# Altium footprint library MS-Electronic.PcbLib: 213 footprints (part 11 of 14)
Each footprint in its own frame and in the unit in brackets; x right, y up, seen from the top. Pads: shape width x height; smd on the part's side, far side on the other; paste and mask are expansions set on the pad; w line width, h text height; cw(c..) or ccw(c..) is an arc to the next point about the centre after c.
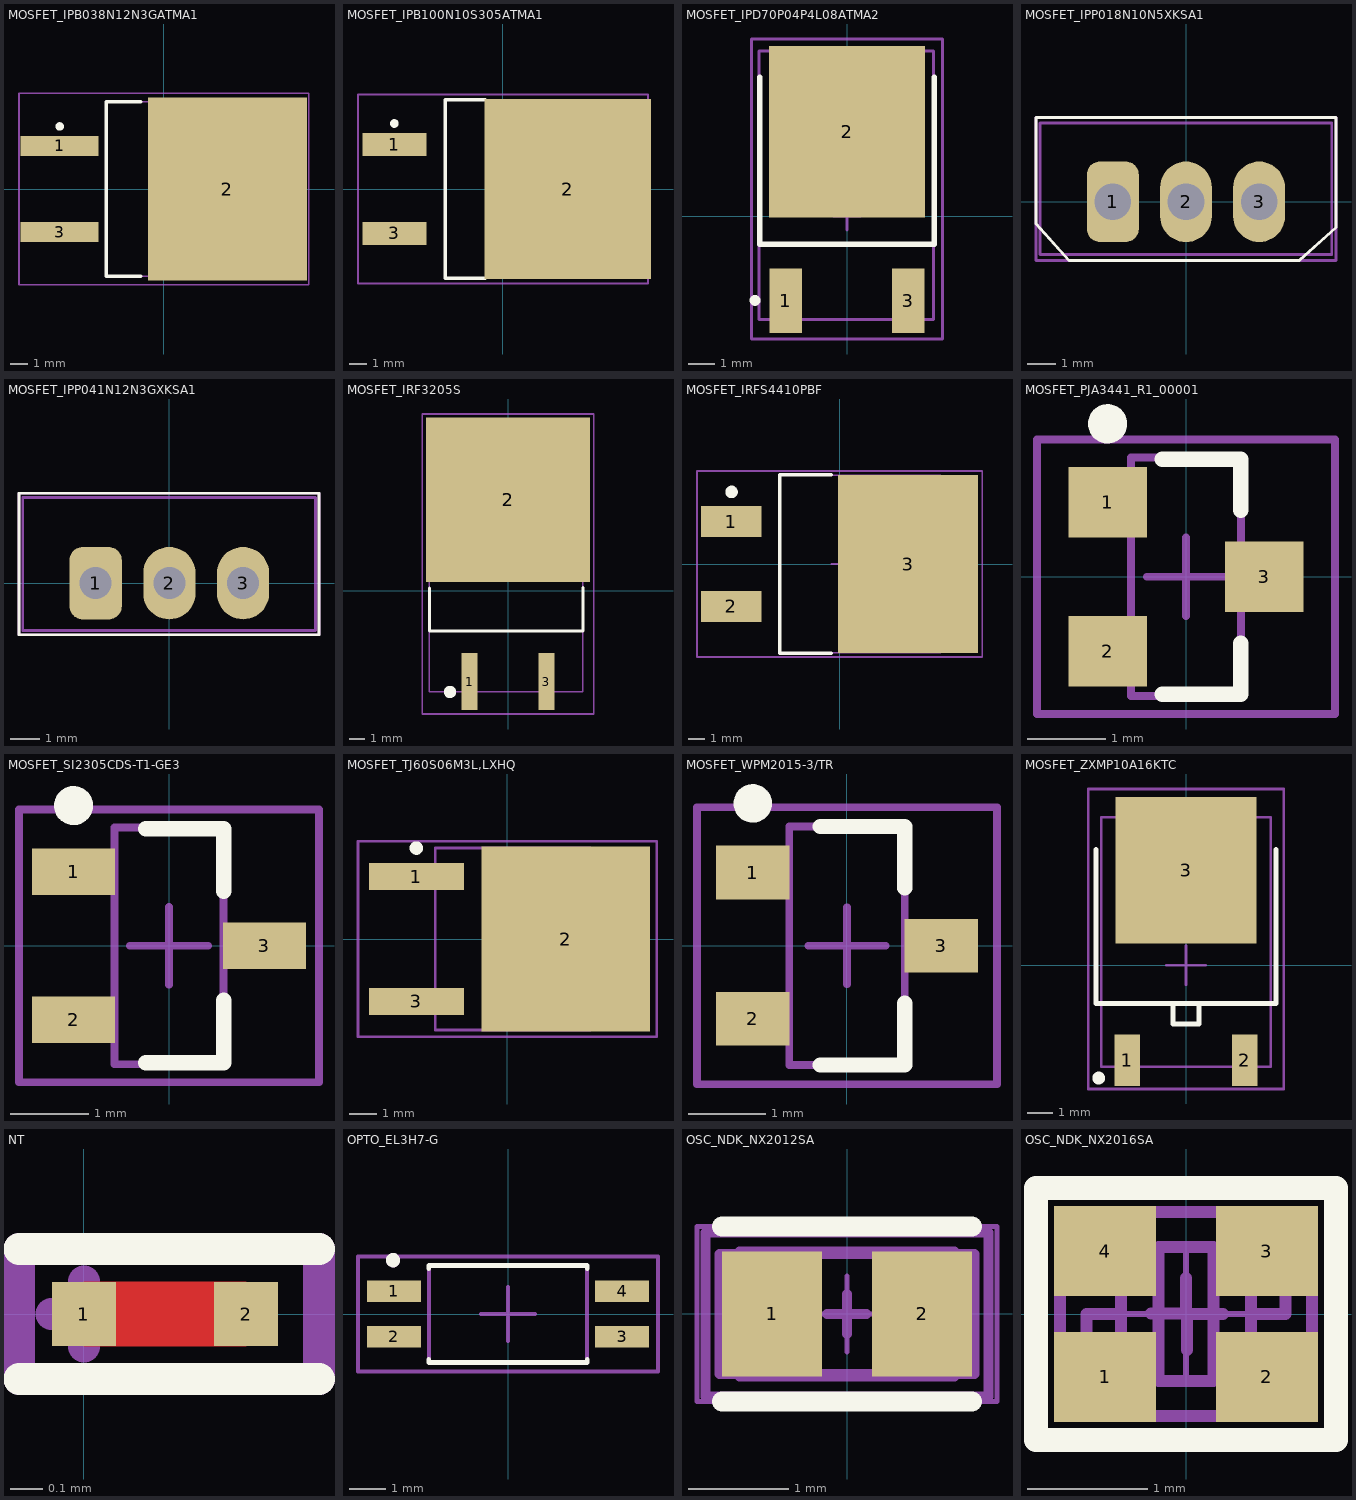
[diagram p10: the footprints below, top view; thin cyan lines are the x and y axes]

## MOSFET_IPB038N12N3GATMA1 [mm]
height 4.58
pads (3):
  rect 4.6x1.2 smd: 1(-6.15,2.54) 3(-6.15,-2.54)
  rect 9.4x10.8 smd: 2(3.75,0)
Top Overlay:
  circle w0.25: c-6.15,3.69 r0.125
  lines w0.2: -1.35,-5.15 -3.4,-5.15 -3.4,5.15 -1.35,5.15
Top Assembly:
  lines w0.1: -3.4,-5.15 6.05,-5.15 6.05,5.15 -3.4,5.15 -3.4,-5.15
  text ".Designator" at -2.499,-0.167 h0.5
Top Component Center (Mech15):
  lines w0.1: -0.5,0 0.5,0 ; 0,-0.5 0,0.5 ; -8.55,-5.65 8.55,-5.65 8.55,5.65 -8.55,5.65 -8.55,-5.65
3D body "MOSFET_IPB038N12N3GATMA1.step": height 4.57, standoff 0, extent -7.19,-5.15 8.05,5.15

## MOSFET_IPB100N10S305ATMA1 [mm]
height 4.6
pads (3):
  rect 3.65x1.3 smd: 1(-6.2,2.54) 3(-6.2,-2.54)
  rect 9.5x10.3 smd: 2(3.7,0)
Top Overlay:
  circle w0.25: c-6.2,3.74 r0.125
  lines w0.2: -1,-5.1 -3.3,-5.1 -3.3,5.1 -1,5.1
Top Assembly:
  lines w0.1: -3.3,-5.1 6,-5.1 6,5.1 -3.3,5.1 -3.3,-5.1
  text ".Designator" at -4.998,-0.333 h1
Top Component Center (Mech15):
  lines w0.1: -0.5,0 0.5,0 ; 0,-0.5 0,0.5 ; -8.275,-5.4 8.275,-5.4 8.275,5.4 -8.275,5.4 -8.275,-5.4
3D body "MOSFET_IPB100N10S305ATMA1.step": height 4.6, standoff 0, extent -7.1,-5.1 8.1,5.1

## MOSFET_IPD70P04P4L08ATMA2 [mm]
pads (3):
  rect 1.2x2.4 smd: 1(-2.28,-3.15) 3(2.28,-3.15)
  rect 5.8x6.4 smd: 2(0,3.15)
Top Overlay:
  lines w0.2: -3.25,5.18 -3.25,-1.04 3.25,-1.04 3.25,5.18
  lines w0.3: -3.427,-3.184 cw(c-3.427,-3.134) -3.427,-3.084 cw(c-3.427,-3.134) -3.427,-3.184
Top Assembly:
  lines w0.1: -3.277,-3.848 3.226,-3.848 3.226,6.159 -3.277,6.159 -3.277,-3.848
  text ".Designator" at -2.999,-0.2 h0.6
Top Component Center (Mech15):
  lines w0.1: -0.508,0 0,0 ; 0,-0.508 0,0 ; 0,0.508 0,0 ; 0.508,0 0,0 ; -3.556,-4.572 3.556,-4.572 3.556,6.604 -3.556,6.604 -3.556,-4.572
3D body "IPD70P04P4L08ATMA2.stp": height 2.45, standoff 0, extent -3.275,-3.848 3.225,6.157

## MOSFET_IPP018N10N5XKSA1 [mm]
pads (3):
  rrect50% 1.8x2.8 hole 1.27: 1(-2.54,0)
  oval 1.8x2.8 hole 1.27: 2(0,0) 3(2.54,0)
Top Overlay:
  lines w0.1: -5.207,-0.762 -5.207,2.921 5.207,2.921 5.207,-0.889 3.937,-2.032 -4.064,-2.032 -5.207,-0.762
Top Assembly:
  lines w0.1: -5.062,-1.834 -5.062,2.74 5.06,2.74 5.06,-1.834 -5.062,-1.834
  text ".Designator" at -2.999,-0.2 h0.6
Top Component Center (Mech15):
  lines w0.1: -0.478,0 0,0 ; 0,-0.478 0,0 ; 0,0.478 0,0 ; 0.478,0 0,0 ; -5.207,-2.032 -5.207,2.921 5.207,2.921 5.207,-2.032 -5.207,-2.032
3D body "PG-TO220-3.STEP": height 20.15, standoff -8.73, extent -5.05,-1.833 5.05,2.737

## MOSFET_IPP041N12N3GXKSA1 [mm]
pads (3):
  rrect50% 1.8x2.5 hole 1.1: 1(-2.54,0)
  oval 1.8x2.5 hole 1.1: 2(0,0) 3(2.54,0)
Top Overlay:
  lines w0.1: -5.182,-1.778 -5.182,3.099 5.156,3.099 5.156,-1.778 -5.182,-1.778
Top Assembly:
  lines w0.1: -5.052,-1.626 5.033,-1.626 5.033,2.946 -5.052,2.946 -5.052,-1.626
  text ".Designator" at -2.499,-0.167 h0.5
Top Component Center (Mech15):
  lines w0.1: -0.762,0 0,0 ; 0,-0.762 0,0 ; 0,0.762 0,0 ; 0.762,0 0,0 ; -5.182,-1.778 -5.182,3.099 5.156,3.099 5.156,-1.778 -5.182,-1.778
3D body "IPP041N12N3GXKSA1.stp": height 20.18, standoff -17.96, extent -5.015,-1.626 5.015,2.944

## MOSFET_IRF3205S [mm]
pads (3):
  rect 1.06x3.78 smd mask+0.102: 1(-2.54,-6.01) 3(2.54,-6.01)
  rect 10.84x10.88 smd paste-6: 2(0,6.01)
Top Overlay:
  circle w0.5: c-3.835,-6.69 r0.155
  lines w0.2: -5.197,0.185 -5.197,-2.652 4.958,-2.652 4.958,0.209
Top Paste:
  region: -3.9,8.13 -3.9,6.61 -5.15,6.61 -5.15,8.13
  region: -3.9,5.5 -3.9,3.98 -5.15,3.98 -5.15,5.5
  region: -3.9,2.87 -3.9,1.35 -5.15,1.35 -5.15,2.87
  region: -2.09,8.13 -2.09,6.61 -3.34,6.61 -3.34,8.13
  region: -2.09,5.5 -2.09,3.98 -3.34,3.98 -3.34,5.5
  region: -2.09,2.87 -2.09,1.35 -3.34,1.35 -3.34,2.87
  region: 5.15,8.13 5.15,6.61 3.9,6.61 3.9,8.13
  region: 5.15,5.5 5.15,3.98 3.9,3.98 3.9,5.5
  region: 5.15,2.87 5.15,1.35 3.9,1.35 3.9,2.87
  region: 3.34,8.13 3.34,6.61 2.09,6.61 2.09,8.13
  region: 3.34,5.5 3.34,3.98 2.09,3.98 2.09,5.5
  region: 3.34,2.87 3.34,1.35 2.09,1.35 2.09,2.87
  region: 1.53,8.13 1.53,6.61 0.28,6.61 0.28,8.13
  region: 1.53,5.5 1.53,3.98 0.28,3.98 0.28,5.5
  region: 1.53,2.87 1.53,1.35 0.28,1.35 0.28,2.87
  region: -0.28,8.13 -0.28,6.61 -1.53,6.61 -1.53,8.13
  region: -0.28,5.5 -0.28,3.98 -1.53,3.98 -1.53,5.5
  region: -0.28,2.87 -0.28,1.35 -1.53,1.35 -1.53,2.87
Top Assembly:
  lines w0.1: -5.207,-6.69 -5.207,8.55 4.953,8.55 4.953,-6.69 -5.207,-6.69
  text ".Designator" at -3.999,-0.267 h0.8
Top Component Center (Mech15):
  lines w0.1: -5.67,-8.15 -5.67,11.684 5.67,11.684 5.67,-8.15 -5.67,-8.15

## MOSFET_IRFS4410PBF [mm]
height 4.83
pads (3):
  rect 3.65x1.85 smd: 1(-6.5,2.54) 2(-6.5,-2.54)
  rect 8.4x10.65 smd: 3(4.1,0)
Top Overlay:
  circle w0.5: c-6.477,4.318 r0.125
  lines w0.2: -0.5,-5.35 -3.6,-5.35 -3.6,5.35 -0.5,5.35
Top Assembly:
  lines w0.1: -3.6,-5.325 -3.6,5.325 6.05,5.325 6.05,-5.325 -3.6,-5.325
  text ".Designator" at -2.999,-0.2 h0.6
Top Component Center (Mech15):
  lines w0.1: -0.5,0 0.5,0 ; 0,-0.5 0,0.5 ; -8.55,-5.575 -8.55,5.575 8.55,5.575 8.55,-5.575 -8.55,-5.575

## MOSFET_PJA3441_R1_00001 [mm]
height 1.1
pads (3):
  rect 1x0.9 smd: 1(-1,0.95) 2(-1,-0.95) 3(1,0)
Top Overlay:
  circle w0.25: c-1,1.95 r0.125
  lines w0.2: -0.3,-1.5 0.7,-1.5 0.7,-0.85 ; -0.3,1.5 0.7,1.5 0.7,0.85
Top Assembly:
  lines w0.1: -0.7,-1.52 -0.7,1.52 0.7,1.52 0.7,-1.52 -0.7,-1.52
  text ".Designator" at -1.999,-0.133 h0.4
Top Component Center (Mech15):
  lines w0.1: -0.5,0 0.5,0 ; 0,-0.5 0,0.5 ; -1.9,-1.75 -1.9,1.75 1.9,1.75 1.9,-1.75 -1.9,-1.75
3D body "MOSFET_PJA3441_R1_00001.step": height 1.1, standoff 0, extent -1.35,-1.52 1.35,1.52

## MOSFET_SI2305CDS-T1-GE3 [mm]
height 1.12
pads (3):
  rect 1.07x0.6 smd: 1(-1.225,0.95) 2(-1.225,-0.95) 3(1.225,0)
Top Overlay:
  circle w0.25: c-1.225,1.8 r0.125
  lines w0.2: -0.3,-1.5 0.7,-1.5 0.7,-0.7 ; -0.3,1.5 0.7,1.5 0.7,0.7
Top Assembly:
  lines w0.1: -0.7,-1.52 -0.7,1.52 0.7,1.52 0.7,-1.52 -0.7,-1.52
  text ".Designator" at -2.999,-0.2 h0.6
Top Component Center (Mech15):
  lines w0.1: -0.5,0 0.5,0 ; 0,-0.5 0,0.5 ; -1.925,-1.75 -1.925,1.75 1.925,1.75 1.925,-1.75 -1.925,-1.75
3D body "MOSFET_SI2305CDS-T1-GE3.step": height 1.12, standoff 0, extent -1.32,-1.52 1.32,1.52

## MOSFET_TJ60S06M3L,LXHQ [mm]
height 2.5
pads (3):
  rect 3.5x1 smd: 1(-3.35,2.3) 3(-3.35,-2.3)
  rect 6.2x6.8 smd: 2(2.15,0)
Top Overlay:
  circle w0.25: c-3.35,3.35 r0.125
Top Assembly:
  lines w0.1: -2.65,-3.35 -2.65,3.35 3.05,3.35 3.05,-3.35 -2.65,-3.35
  text ".Designator" at -2.999,-0.2 h0.6
Top Component Center (Mech15):
  lines w0.1: -0.5,0 0.5,0 ; 0,-0.5 0,0.5 ; -5.5,-3.6 -5.5,3.6 5.5,3.6 5.5,-3.6 -5.5,-3.6
3D body "MOSFET_TJ60S06M3L,LXHQ.step": height 2.5, standoff 0, extent -4.597,-3.35 4.9,3.35

## MOSFET_WPM2015-3/TR [mm]
height 1.3
pads (3):
  rect 0.95x0.7 smd: 1(-1.225,0.95) 2(-1.225,-0.95) 3(1.225,0)
Top Overlay:
  circle w0.25: c-1.225,1.85 r0.125
  lines w0.2: -0.35,-1.55 0.75,-1.55 0.75,-0.75 ; -0.35,1.55 0.75,1.55 0.75,0.75
Top Assembly:
  lines w0.1: -0.75,-1.55 -0.75,1.55 0.75,1.55 0.75,-1.55 -0.75,-1.55
  text ".Designator" at -2.999,-0.2 h0.6
Top Component Center (Mech15):
  lines w0.1: -0.5,0 0.5,0 ; 0,-0.5 0,0.5 ; -1.95,-1.8 -1.95,1.8 1.95,1.8 1.95,-1.8 -1.95,-1.8
3D body: height 1.3, standoff 0, extent -0.75,-1.55 0.75,1.55

## MOSFET_ZXMP10A16KTC [mm]
pads (3):
  rect 1x2 smd mask+0.07: 1(-2.285,-3.7) 2(2.285,-3.7)
  rect 5.5x5.7 smd mask+0.07: 3(0,3.7)
Top Overlay:
  circle w0.25: c-3.4,-4.4 r0.125
  lines w0.2: -3.5,4.5 -3.5,-1.5 3.5,-1.5 3.5,4.5 ; -2.8,-1.5 -1.8,-1.5 ; 1.8,-1.5 2.8,-1.5 ; -0.5,-2.3 -0.5,-1.5 0.5,-1.5 0.5,-2.3 -0.5,-2.3
Top Assembly:
  lines w0.1: -3.303,-3.959 -3.303,5.756 3.302,5.756 3.302,-3.959 -3.303,-3.959
  text ".Designator" at -2.499,-0.167 h0.5
Top Component Center (Mech15):
  lines w0.1: -0.762,0 0,0 ; 0,-0.762 0,0 ; 0,0.762 0,0 ; 0.762,0 0,0 ; -3.81,-4.826 -3.81,6.858 3.81,6.858 3.81,-4.826 -3.81,-4.826
3D body "DPAK.stp": height 2.31, standoff 0, extent -3.3,-3.951 3.3,5.762

## NT [mm]
pads (2):
  rect 0.2x0.2 smd mask+0.102: 1(0,0) 2(0.508,0)
Top Layer:
  region: 0,-0.102 0.508,-0.102 0.508,0.102 0,0.102
Top Overlay:
  lines w0.1: -0.203,-0.203 0.737,-0.203 ; -0.203,0.203 0.737,0.203
Top Assembly:
  lines w0.1: -0.203,-0.203 0.737,-0.203 0.737,0.203 -0.203,0.203 -0.203,-0.203
  text ".Designator" at -1,-0.067 h0.2
Top Component Center (Mech15):
  lines w0.1: -0.102,0 0,0 ; 0,-0.102 0,0 ; 0,0.102 0,0 ; 0.102,0 0,0 ; -0.203,-0.203 -0.203,0.203 0.737,0.203 0.737,-0.203 -0.203,-0.203

## OPTO_EL3H7-G [mm]
pads (4):
  rect 1.5x0.6 smd mask+0.07: 1(-3.175,0.635) 2(-3.175,-0.635) 3(3.175,-0.635) 4(3.175,0.635)
Top Overlay:
  circle w0.2: c-3.2,1.499 r0.1
  lines w0.127: -2.2,-1.255 -2.2,-1.35 2.2,-1.35 2.2,-1.255 ; -2.2,1.255 -2.2,1.35 2.2,1.35 2.2,1.255
Top Assembly:
  circle w0.2: c-3.2,1.499 r0.1
  lines w0.1: -2.2,-1.35 2.2,-1.35 2.2,1.35 -2.2,1.35 -2.2,-1.35
  text ".Designator" at -2.499,-0.167 h0.5
Top Component Center (Mech15):
  lines w0.1: -0.762,0 0,0 ; 0,-0.762 0,0 ; 0,0.762 0,0 ; 0.762,0 0,0 ; -4.175,-1.6 -4.175,1.6 4.175,1.6 4.175,-1.6 -4.175,-1.6
3D body "User Library-SSOP-4.STEP": height 2, standoff -0.02, extent -3.5,-1.397 3.5,1.303

## OSC_NDK_NX2012SA [mm] "Crystal, 2-Leads, Body 2.05x1.20x0.55mm (Tol:-/+0.05)"
height 0.55
pads (2):
  rect 1x1.25 smd: 1(-0.75,0) 2(0.75,0)
Top Overlay:
  lines w0.2: -1.25,-0.875 1.25,-0.875 ; -1.25,0.875 1.25,0.875
Top Assembly:
  lines w0.1: -1.275,-0.6 1.275,-0.6 1.275,0.6 -1.275,0.6 -1.275,-0.6
  text ".Designator" at -2.499,-0.167 h0.5
Bottom 3D Body:
  lines w0.1: -1.275,-0.4 cw(c-1.275,-0.6) -1.077,-0.625 1.077,-0.625 cw(c1.275,-0.6) 1.275,-0.4 1.275,0.4 cw(c1.275,0.6) 1.077,0.625 -1.077,0.625 cw(c-1.275,0.6) -1.275,0.4 -1.275,-0.4
Top Component Center (Mech15):
  lines w0.1: -0.2,0.001 0,0.001 0,0.2 ; -0.003,0.002 0.197,0.002 ; -0.002,-0.198 -0.002,0.002 ; -1.417,-0.825 -1.417,0.813 1.416,0.813 1.416,-0.825 -1.417,-0.825
Mechanical 17:
  lines w0.05: -0.381,0 0.381,0 ; 0,-0.381 0,0.381 ; -1.5,-0.875 -1.5,0.875 1.5,0.875 1.5,-0.875 -1.5,-0.875
3D body: height 0.55, standoff 0, extent -1.038,-0.625 1.025,0.625

## OSC_NDK_NX2016SA [mm] "Crystal, 4-Leads, Body 2.10x1.61x0.50mm (max), Pitch 1.35x1.05mm"
height 0.45
pads (4):
  rect 0.85x0.75 smd: 1(-0.675,-0.525) 2(0.675,-0.525) 3(0.675,0.525) 4(-0.675,0.525)
Top Overlay:
  lines w0.2: -1.25,-1.05 -1.25,1.05 1.25,1.05 1.25,-1.05 -1.25,-1.05
  text "." at -1.494,-1.538 h4
Top Assembly:
  lines w0.1: -1.05,-0.85 1.05,-0.85 1.05,0.85 -1.05,0.85 -1.05,-0.85
  text ".Designator" at -2.499,-0.167 h0.5
Bottom 3D Body:
  lines w0.1: -0.83,-0.45 -0.83,0 -0.54,0 ; -0.54,-0.3 -0.54,0.3 ; 0.54,-0.3 0.54,0.3 ; 0.54,0 0.83,0 0.83,0.45 ; -1.05,-0.65 cw(c-1.05,-0.85) -0.85,-0.85 0.85,-0.85 cw(c1.05,-0.85) 1.05,-0.65 1.05,0.65 cw(c1.05,0.85) 0.85,0.85 -0.85,0.85 cw(c-1.05,0.85) -1.05,0.65 -1.05,-0.65 ; -0.23,-0.56 0.23,-0.56 0.23,0.56 -0.23,0.56 -0.23,-0.56
  text "." at -0.7,-0.7 h3
Top Component Center (Mech15):
  lines w0.1: -0.294,0.003 0.006,0.003 ; 0,0 0,0.3 ; 0.006,-0.3 0.006,0 0.306,0 ; -1.25,-1.05 1.25,-1.05 1.25,1.05 -1.25,1.05 -1.25,-1.05
Mechanical 17:
  lines w0.05: -0.5,0 0.5,0 ; 0,-0.5 0,0.5 ; -1.25,-1.05 -1.25,1.05 1.25,1.05 1.25,-1.05 -1.25,-1.05
3D body "OSC_NDK_NX2016SA.STEP": height 0.5, standoff 0, extent -1,-0.8 1,0.8